# Altium footprint library Mylib.PcbLib: 294 footprints (part 10 of 19)
Each footprint in its own frame and in the unit in brackets; x right, y up, seen from the top. Pads: shape width x height; smd on the part's side, far side on the other; paste and mask are expansions set on the pad; w line width, h text height; cw(c..) or ccw(c..) is an arc to the next point about the centre after c.
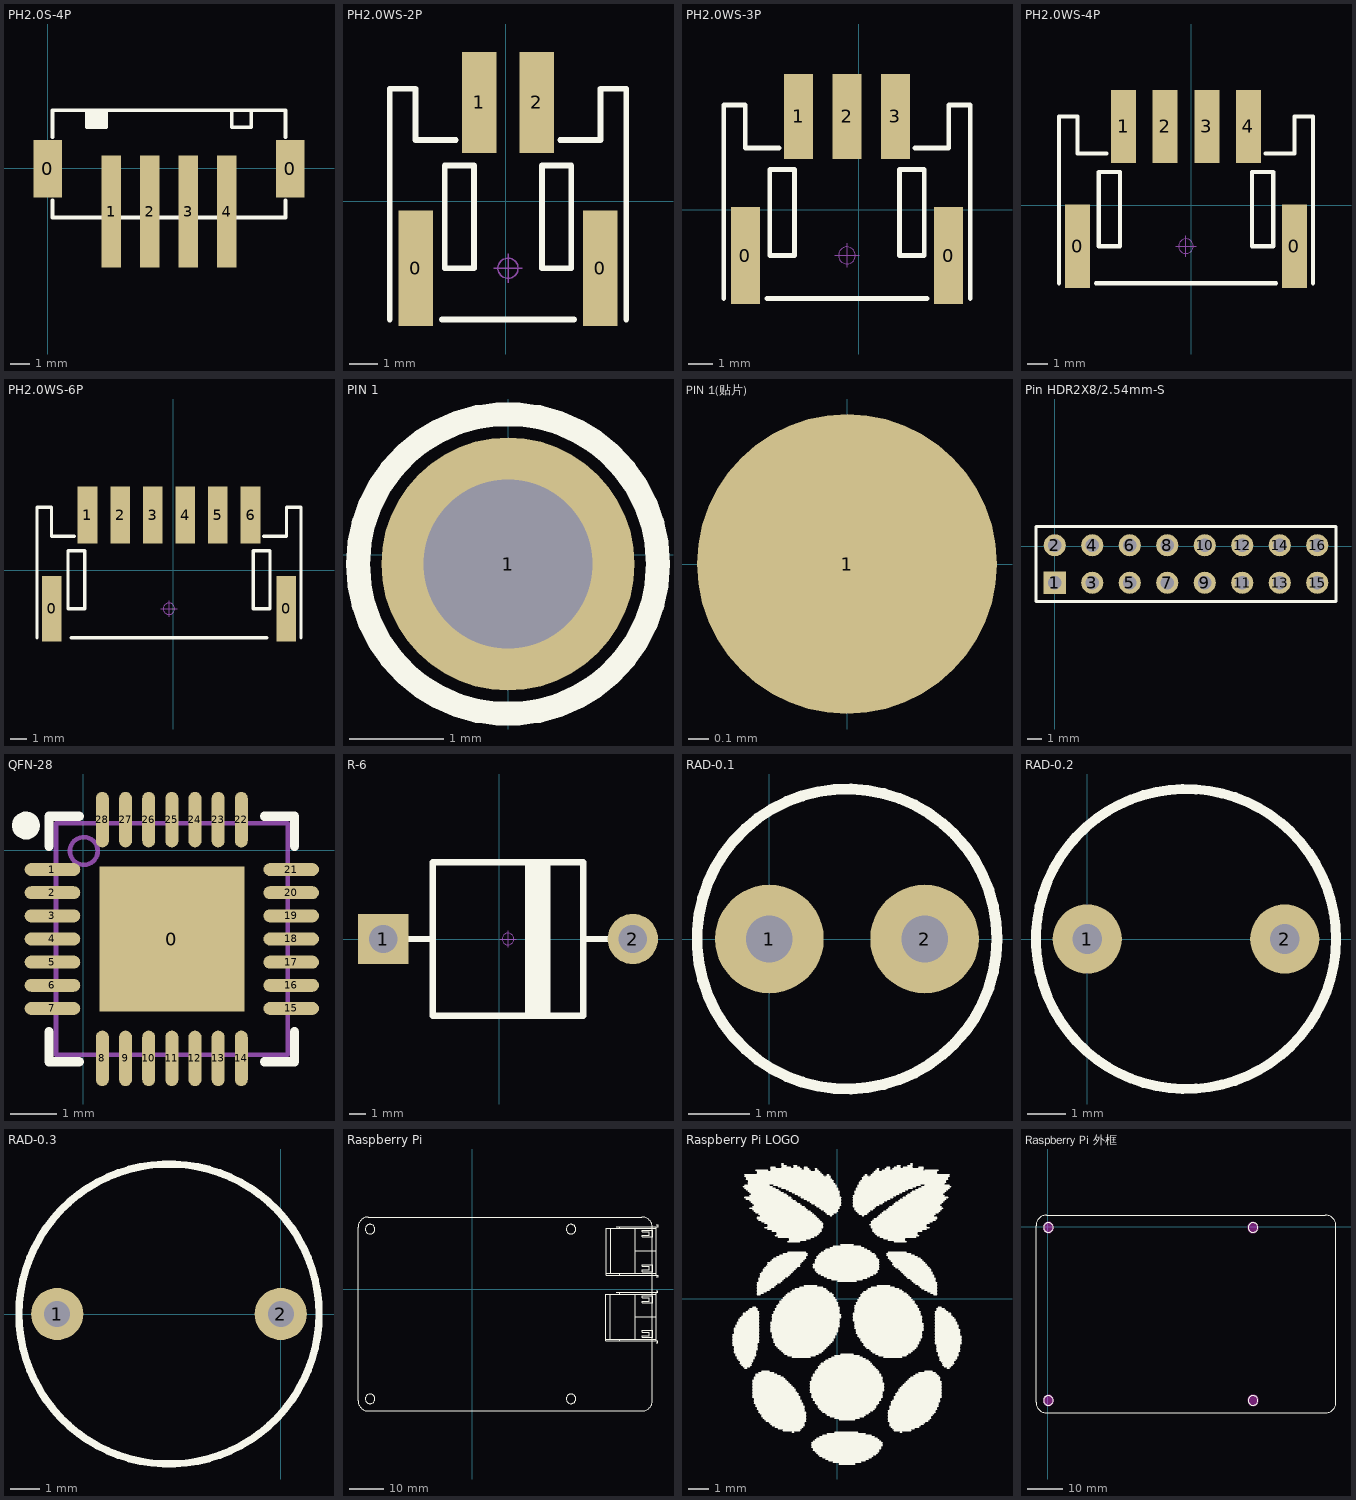
[diagram p9: the footprints below, top view; thin cyan lines are the x and y axes]

## PH2.0S-4P [mil]
pads (6):
  rect 59.06x118.11 smd: 0(-0.16,-1.22) 0(497.32,-1.22)
  rect 40x230 smd: 1(130.47,-89.33) 2(209.21,-89.33) 3(287.95,-89.33) 4(366.69,-89.33)
Top Overlay:
  rectangle: 79.84,83.78 119.84,118.78
  lines w7.87: 9.84,-66.22 9.84,-101.22 487.32,-101.22 487.32,-66.22 ; 9.84,63.78 9.84,118.78 487.32,118.78 487.32,63.78 ; 79.84,118.78 79.84,83.78 119.84,83.78 119.84,118.78 ; 377.32,118.78 377.32,83.78 417.32,83.78 417.32,118.78
3D body "PH2.0-LS-4P.STEP": height 242.13, standoff 0, extent 12.36,-190.31 484.8,116.78

## PH2.0WS-2P [mm]
pads (4):
  rect 1.2x4 smd: 0(-3.114,-2.321) 0(3.286,-2.321)
  rect 1.2x3.5 smd: 1(-0.914,3.429) 2(1.086,3.429)
Top Overlay:
  lines w0.2: -4.01,-4.093 -4.01,3.908 -3.121,3.908 -3.121,2.13 -1.724,2.13 ; -2.2,-4.093 2.372,-4.093 ; 1.896,2.13 3.293,2.13 3.293,3.908 4.182,3.908 4.182,-4.093 ; -2.105,-2.315 -1.089,-2.315 -1.089,1.241 -2.105,1.241 -2.105,-2.315 ; 1.261,-2.315 2.277,-2.315 2.277,1.241 1.261,1.241 1.261,-2.315
Mechanical 15:
  circle w0.05: c0.086,-2.315 r0.35
  lines w0.05: -0.414,-2.315 0.586,-2.315 ; 0.086,-2.815 0.086,-1.815
3D body "PH2.0 SMD-W-2P.STEP": height 5.55, standoff 0.05, extent -3.914,-3.965 4.086,4.635

## PH2.0WS-3P [mm]
pads (5):
  rect 1.2x4 smd: 0(-4.685,-1.889) 0(3.715,-1.889)
  rect 1.2x3.5 smd: 1(-2.485,3.861) 2(-0.485,3.861) 3(1.515,3.861)
Top Overlay:
  lines w0.2: -5.581,-3.661 -5.581,4.34 -4.692,4.34 -4.692,2.562 -3.295,2.562 ; -3.787,-3.661 2.817,-3.661 ; 2.325,2.562 3.722,2.562 3.722,4.34 4.611,4.34 4.611,-3.661 ; -3.676,-1.883 -3.676,1.673 -2.66,1.673 -2.66,-1.883 -3.676,-1.883 ; 1.69,-1.883 1.69,1.673 2.706,1.673 2.706,-1.883 1.69,-1.883
Mechanical 15:
  circle w0.05: c-0.485,-1.883 r0.35
  lines w0.05: -0.985,-1.883 0.015,-1.883 ; -0.485,-2.383 -0.485,-1.383
3D body "PH2.0 SMD-W-3P.STEP": height 5.55, standoff 0.05, extent -5.485,-3.533 4.515,5.067

## PH2.0WS-4P [mm]
pads (6):
  rect 1.2x4 smd: 0(-5.445,-1.962) 0(4.955,-1.962)
  rect 1.2x3.5 smd: 1(-3.245,3.788) 2(-1.245,3.788) 3(0.755,3.788) 4(2.755,3.788)
Top Overlay:
  lines w0.2: -6.341,-3.735 -6.341,4.266 -5.452,4.266 -5.452,2.488 -4.055,2.488 ; -4.563,-3.735 4.073,-3.735 ; 3.565,2.488 4.962,2.488 4.962,4.266 5.851,4.266 5.851,-3.735 ; -4.436,-1.957 -3.42,-1.957 -3.42,1.599 -4.436,1.599 -4.436,-1.957 ; 2.93,-1.957 3.946,-1.957 3.946,1.599 2.93,1.599 2.93,-1.957
Mechanical 15:
  circle w0.05: c-0.245,-1.957 r0.35
  lines w0.05: -0.745,-1.957 0.255,-1.957 ; -0.245,-2.457 -0.245,-1.457
3D body "PH2.0 SMD-W-4P.STEP": height 5.55, standoff 0.05, extent -6.245,-3.607 5.755,4.993

## PH2.0WS-6P [mm]
pads (8):
  rect 1.2x4 smd: 0(-7.453,-2.365) 0(6.947,-2.365)
  rect 1.2x3.5 smd: 1(-5.253,3.385) 2(-3.253,3.385) 3(-1.253,3.385) 4(0.747,3.385) 5(2.747,3.385) 6(4.747,3.385)
Top Overlay:
  lines w0.2: -8.349,-4.137 -8.349,3.864 -7.46,3.864 -7.46,2.086 -6.063,2.086 ; -6.253,-4.137 5.747,-4.137 ; 5.557,2.086 6.954,2.086 6.954,3.864 7.843,3.864 7.843,-4.137 ; -6.444,-2.359 -5.428,-2.359 -5.428,1.197 -6.444,1.197 -6.444,-2.359 ; 4.922,-2.359 5.938,-2.359 5.938,1.197 4.922,1.197 4.922,-2.359
Mechanical 15:
  circle w0.05: c-0.253,-2.359 r0.35
  lines w0.05: -0.753,-2.359 0.247,-2.359 ; -0.253,-2.859 -0.253,-1.859
3D body "PH2.0 SMD-W-6P.STEP": height 5.55, standoff 0.05, extent -8.253,-4.009 7.747,4.591

## PIN 1 [mm]
pads (1):
  round 2.7 hole 1.8: 1(0,-0.1)
Top Overlay:
  circle w0.254: c0,-0.1 r1.6

## PIN 1(贴片) [mm]
pads (1):
  round 1.5 smd: 1(0,0)

## Pin HDR2X8/2.54mm-S [mm]
pads (16):
  rect 1.5x1.5 hole 0.9: 1(0.001,-2.463)
  round 1.5 hole 0.9: 2(0.001,0.077) 3(2.541,-2.463) 4(2.541,0.077) 5(5.081,-2.463) 6(5.081,0.077) 7(7.621,-2.463) 8(7.621,0.077) 9(10.161,-2.463) 10(10.161,0.077) 11(12.701,-2.463) 12(12.701,0.077) 13(15.241,-2.463) 14(15.241,0.077) 15(17.781,-2.463) 16(17.781,0.077)
Top Overlay:
  lines w0.2: -1.269,-3.733 19.051,-3.733 19.051,1.347 -1.269,1.347 -1.269,-3.733
3D body "HEADER.STEP": height 7.58, standoff -2.94, extent 16.511,-1.193 19.051,1.347
3D body "HEADER.STEP": height 7.58, standoff -2.94, extent 16.511,-3.733 19.051,-1.193
3D body "HEADER.STEP": height 7.58, standoff -2.94, extent 13.971,-1.193 16.511,1.347
3D body "HEADER.STEP": height 7.58, standoff -2.94, extent 13.971,-3.733 16.511,-1.193
3D body "HEADER.STEP": height 7.58, standoff -2.94, extent 11.431,-1.193 13.971,1.347
3D body "HEADER.STEP": height 7.58, standoff -2.94, extent 11.431,-3.733 13.971,-1.193
3D body "HEADER.STEP": height 7.58, standoff -2.94, extent 8.891,-1.193 11.431,1.347
3D body "HEADER.STEP": height 7.58, standoff -2.94, extent 8.891,-3.733 11.431,-1.193
3D body "HEADER.STEP": height 7.58, standoff -2.94, extent 6.351,-1.193 8.891,1.347
3D body "HEADER.STEP": height 7.58, standoff -2.94, extent 6.351,-3.733 8.891,-1.193
3D body "HEADER.STEP": height 7.58, standoff -2.94, extent 3.811,-1.193 6.351,1.347
3D body "HEADER.STEP": height 7.58, standoff -2.94, extent 3.811,-3.733 6.351,-1.193
3D body "HEADER.STEP": height 7.58, standoff -2.94, extent 1.271,-1.193 3.811,1.347
3D body "HEADER.STEP": height 7.58, standoff -2.94, extent 1.271,-3.733 3.811,-1.193
3D body "HEADER.STEP": height 7.58, standoff -2.94, extent -1.269,-1.193 1.271,1.347
3D body "HEADER.STEP": height 7.58, standoff -2.94, extent -1.269,-3.733 1.271,-1.193

## QFN-28 [mm] "CP2102  USB转串口芯片"
pads (29):
  rect 3.13x3.13 smd mask+0.051: 0(1.909,-1.918)
  oval 1.2x0.28 smd mask+0.051: 1(-0.668,-0.418) 2(-0.668,-0.918) 3(-0.668,-1.418) 4(-0.668,-1.918) 5(-0.668,-2.418) 6(-0.668,-2.918) 7(-0.668,-3.418) 15(4.486,-3.418) 16(4.486,-2.918) 17(4.486,-2.418) 18(4.486,-1.918) 19(4.486,-1.418) 20(4.486,-0.918) 21(4.486,-0.418)
  oval 0.28x1.2 smd mask+0.051: 8(0.409,-4.495) 9(0.909,-4.495) 10(1.409,-4.495) 11(1.909,-4.495) 12(2.409,-4.495) 13(2.909,-4.495) 14(3.409,-4.495) 22(3.409,0.66) 23(2.909,0.66) 24(2.409,0.66) 25(1.909,0.66) 26(1.409,0.66) 27(0.909,0.66) 28(0.409,0.66)
Top Overlay:
  circle w0.3: c-1.241,0.532 r0.15
  lines w0.2: -0.741,-3.918 -0.741,-4.568 -0.091,-4.568 ; -0.741,0.082 -0.741,0.732 -0.091,0.732 ; 3.909,-4.568 4.559,-4.568 4.559,-3.918 ; 3.909,0.732 4.559,0.732 4.559,0.082
Mechanical 13:
  circle w0.1: c0.009,-0.018 r0.3
  lines w0.1: -0.591,-4.418 -0.591,0.582 4.409,0.582 4.409,-4.418 -0.591,-4.418
3D body "User Library-QFN28-0_5.STEP": height 1, standoff 0, extent -0.578,-4.416 4.422,0.584

## R-6 [mm] "二极管"
pads (2):
  rect 3x3 hole 1.7: 1(-6.917,0.025)
  round 3 hole 1.7: 2(7.983,0.025)
Top Overlay:
  rectangle: 1.549,-4.547 3.073,4.597
  lines w0.381: -5.523,0.025 -3.967,0.025 ; 5.033,0.025 6.557,0.025 ; -3.967,-4.547 5.033,-4.547 5.033,4.597 -3.967,4.597 -3.967,-4.547
Mechanical 15:
  circle w0.05: c0.533,0.025 r0.35
  lines w0.05: 0.033,0.025 1.033,0.025 ; 0.533,-0.475 0.533,0.525
3D body "R-6.STEP": height 8.85, standoff -3.45, extent -7.567,-4.376 8.633,4.426

## RAD-0.1 [mil]
pads (2):
  round 70 hole 30: 1(0,0) 2(100,0)
Top Overlay:
  circle w7: c50,0 r96.65

## RAD-0.2 [mil]
pads (2):
  round 70 hole 30: 1(0,0) 2(200,0)
Top Overlay:
  circle w10: c100,0 r151.92
3D body: height 472.44, standoff -98.43, extent -96.56,-197.84 296.57,195.86

## RAD-0.3 [mil]
pads (2):
  round 70 hole 35: 1(-300,0) 2(0,0)
Top Overlay:
  circle w10: c-150,0 r201.21
3D body: height 1000, standoff -1131.89, extent -417,-243.84 102.01,275.84

## Raspberry Pi [mm]
Top Overlay:
  circle w0.254: c28.556,-31.719 r1.375
  circle w0.254: c-29.444,17.281 r1.375
  circle w0.254: c-29.444,-31.719 r1.375
  circle w0.254: c28.556,17.281 r1.375
  lines w0.1: 38.606,-14.465 42.606,-14.465 ; 38.681,4.535 42.681,4.535 ; 39.906,-14.465 39.906,-1.465 ; 39.981,4.535 39.981,17.535 ; 41.606,-0.965 53.106,-0.965 ; 41.681,18.035 53.181,18.035 ; 42.606,-14.965 42.606,-14.465 ; 42.606,-0.965 42.606,-1.465 53.106,-1.465 39.906,-1.465 ; 42.681,4.035 42.681,4.535 ; 42.681,18.035 42.681,17.535 53.181,17.535 39.981,17.535 ; 47.106,-14.465 47.106,-1.465 ; 47.106,-7.965 53.106,-7.965 53.106,-0.965 ; 47.181,4.535 47.181,17.535 ; 47.181,11.035 53.181,11.035 53.181,18.035 ; 53.106,-15.465 53.606,-15.465 53.606,-14.965 53.106,-14.965 ; 53.106,-14.465 42.606,-14.465 ; 53.106,-0.465 53.606,-0.465 53.606,-0.965 53.106,-0.965 ; 53.181,3.535 53.681,3.535 53.681,4.035 53.181,4.035 ; 53.181,4.535 42.681,4.535 ; 53.181,18.535 53.681,18.535 53.681,18.035 53.181,18.035 ; 39.906,-1.465 38.606,-1.465 38.606,-7.965 38.606,-14.965 53.106,-14.965 ; 39.981,17.535 38.681,17.535 38.681,11.035 38.681,4.035 53.181,4.035 ; 53.106,-14.965 53.106,-0.965 ; 53.181,4.035 53.181,18.035 ; 49.106,-13.965 49.106,-13.465 51.106,-13.465 51.106,-12.465 49.106,-12.465 49.106,-11.965 52.106,-11.965 52.106,-13.465 52.106,-13.965 49.106,-13.965 ; 49.106,-3.965 49.106,-3.465 51.106,-3.465 51.106,-2.465 49.106,-2.465 49.106,-1.965 52.106,-1.965 52.106,-3.465 52.106,-3.965 49.106,-3.965 ; 49.181,5.035 52.181,5.035 52.181,5.535 52.181,7.035 49.181,7.035 49.181,6.535 51.181,6.535 51.181,5.535 49.181,5.535 49.181,5.035 ; 49.181,15.035 52.181,15.035 52.181,15.535 52.181,17.035 49.181,17.035 49.181,16.535 51.181,16.535 51.181,15.535 49.181,15.535 49.181,15.035
  lines w0.254: -32.944,-32.219 ccw(c-29.944,-32.219) -29.944,-35.219 49.056,-35.219 ccw(c49.056,-32.219) 52.056,-32.219 52.056,17.781 ccw(c49.056,17.781) 49.056,20.781 -29.944,20.781 ccw(c-29.944,17.781) -32.944,17.781 -32.944,-32.219

## Raspberry Pi LOGO [mm]
Top Overlay:
  drawing of 575 lines, arcs and shapes, not listed

## Raspberry Pi 外框 [mm]
Top Overlay:
  circle w0.254: c58.173,-49.219 r1.375
  circle w0.254: c0.173,-0.219 r1.375
  circle w0.254: c0.173,-49.219 r1.375
  circle w0.254: c58.173,-0.219 r1.375
  lines w0.254: -3.327,-49.719 ccw(c-0.327,-49.719) -0.327,-52.719 78.673,-52.719 ccw(c78.673,-49.719) 81.673,-49.719 81.673,0.281 ccw(c78.673,0.281) 78.673,3.281 -0.327,3.281 ccw(c-0.327,0.281) -3.327,0.281 -3.327,-49.719
Keep-Out Layer:
  drawing of 8 lines, arcs and shapes, not listed